# Altium footprint library VESC_MotorController.PcbLib: 146 footprints (part 5 of 10)
Each footprint in its own frame and in the unit in brackets; x right, y up, seen from the top. Pads: shape width x height; smd on the part's side, far side on the other; paste and mask are expansions set on the pad; w line width, h text height; cw(c..) or ccw(c..) is an arc to the next point about the centre after c.
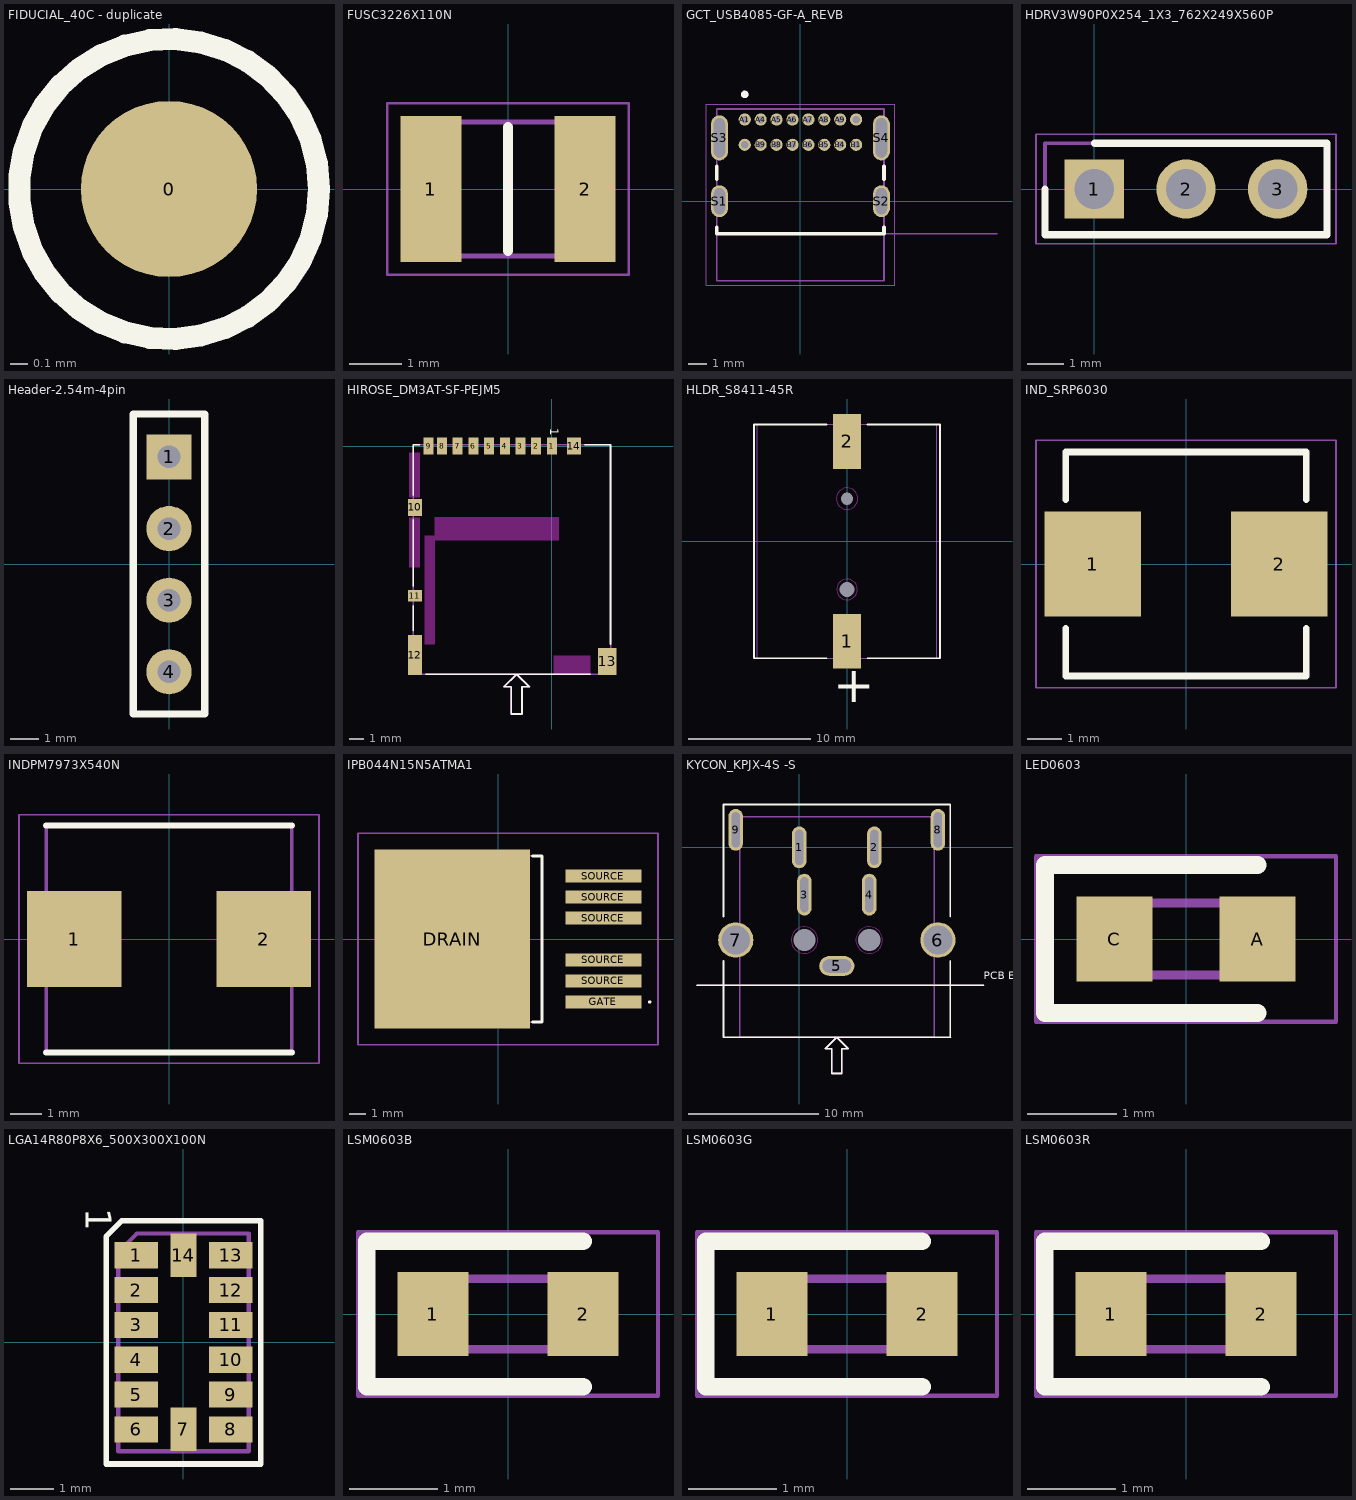
[diagram p4: the footprints below, top view; thin cyan lines are the x and y axes]

## FIDUCIAL_40C - duplicate [mil] "GLOBAL FIDUCIAL"
height 590.55
pads (1):
  round 40 smd paste-78.74 mask+10: 0(0,0)
Top Layer keep-out:
  circle w2: c0,0 r34
Top Overlay:
  circle w5: c0,0 r34
Mechanical 13:
  circle w4: c0,0 r34
  text ".Designator" at 55.03,36.81 h40

## FUSC3226X110N [mm]
pads (2):
  rect 1.18x2.81 smd: 1(-1.485,0) 2(1.485,0)
Top Overlay:
  lines w0.2: 0,-1.188 0,1.188
Mechanical 15:
  lines w0.1: -1.608,-1.288 -1.608,1.288 1.608,1.288 1.608,-1.288 -1.608,-1.288
Mechanical 20:
  lines w0.05: -2.325,-1.655 -2.325,1.655 2.325,1.655 2.325,-1.655 -2.325,-1.655
3D body "srr1210-680m.stp": height 6, standoff -6, extent -6.254,-1.714 5.746,8.286

## GCT_USB4085-GF-A_REVB [mm]
height 3.16
pads (20):
  round 0.65 hole 0.4: A1(-2.975,4.36) A4(-2.125,4.36) A5(-1.275,4.36) A6(-0.425,4.36) A7(0.425,4.36) A8(1.275,4.36) A9(2.125,4.36) A12(2.975,4.36) B1(2.975,3.01) B4(2.125,3.01) B5(1.275,3.01) B6(0.425,3.01) B7(-0.425,3.01) B8(-1.275,3.01) B9(-2.125,3.01) B12(-2.975,3.01)
  oval 0.9x1.7 hole 0.6 slot 1.4 at 90 deg: S1(-4.325,0) S2(4.325,0)
  oval 0.9x2.4 hole 0.6 slot 2.1 at 90 deg: S3(-4.325,3.38) S4(4.325,3.38)
Top Overlay:
  circle w0.2: c-2.975,5.7 r0.1
  lines w0.2: -4.47,-1.39 -4.47,-1.74 4.47,-1.74 4.47,-1.39 ; -4.47,1.17 -4.47,1.85 ; 4.47,1.17 4.47,1.85
Mechanical 13:
  circle w0.2: c-2.975,5.7 r0.1
  lines w0.1: 10.5,-1.74 -4.47,-1.74 ; -4.47,-1.74 -4.47,4.92 4.47,4.92 4.47,-4.25 -4.47,-4.25 -4.47,-1.74
  text "PCB EDGE" at 5.315,-1.57 h0.81
Mechanical 15:
  lines w0.05: -5.025,-4.5 -5.025,5.17 5.025,5.17 5.025,-4.5 -5.025,-4.5
3D body "step_temp.STEP": height 3.46, standoff -2.1, extent -4.47,-4.25 4.47,4.92

## HDRV3W90P0X254_1X3_762X249X560P [mm]
pads (3):
  rect 1.65x1.65 / inner round 1.65 / far side rect 1.65x1.65 hole 1.1: 1(0,0)
  round 1.65 hole 1.1: 2(2.54,0) 3(5.08,0)
Top Overlay:
  lines w0.2: -1.37,0 -1.37,-1.27 6.45,-1.27 6.45,1.27 0,1.27
Mechanical 15:
  lines w0.1: -1.37,-1.27 -1.37,1.27 6.45,1.27 6.45,-1.27 -1.37,-1.27
Mechanical 20:
  lines w0.05: -1.62,-1.52 -1.62,1.52 6.7,1.52 6.7,-1.52 -1.62,-1.52

## Header-2.54m-4pin [mm]
pads (4):
  rect 1.6x1.6 hole 0.8: 1(0,3.81)
  round 1.6 hole 0.8: 2(0,1.27) 3(0,-1.27) 4(0,-3.81)
Top Overlay:
  lines w0.254: -1.27,-5.31 -1.27,5.334 1.27,5.334 1.27,-5.31 -1.27,-5.31

## HIROSE_DM3AT-SF-PEJM5 [mm] "HIROSE_DM3AT-SF-PEJM5"
height 1.83
pads (14):
  rect 0.7x1.2 smd mask+0.051: 1(0,0) 2(-1.1,0) 3(-2.2,0) 4(-3.3,0) 5(-4.4,0) 6(-5.5,0) 7(-6.6,0) 8(-7.7,0) 9(-8.65,0)
  rect 1x1.2 smd mask+0.051: 10(-9.6,-4.3) 14(1.55,0)
  rect 1x0.8 smd mask+0.051: 11(-9.6,-10.5)
  rect 1x2.8 smd mask+0.051: 12(-9.6,-14.65)
  rect 1.3x1.9 smd mask+0.051: 13(3.901,-15.1)
Top Layer keep-out:
  region: -8.2,-6.6 0.5,-6.6 0.5,-5 -8.2,-5
  region: -10.001,-0.45 -10.001,-3.58 -9.25,-3.58 -9.25,-0.45
  region: -10.001,-5.031 -10.001,-8.5 -9.25,-8.5 -9.25,-5.031
  region: -8.9,-6.3 -8.9,-13.9 -8.2,-13.9 -8.2,-6.3
  region: 0.152,-16.049 2.699,-16.049 2.699,-14.699 0.152,-14.699
Top Overlay:
  lines w0.127: -9.725,-3.433 -9.725,0.1 -9.267,0.1 ; -9.723,-5.167 -9.718,-9.829 ; -9.722,-12.95 -9.722,-11.197 ; -8.82,-16.003 2.686,-16.003 ; -2.848,-16.882 -3.354,-16.882 -2.465,-15.993 -1.576,-16.882 -2.084,-16.882 -2.084,-18.787 -2.846,-18.787 -2.846,-16.882 ; 2.317,0.103 4.121,0.103 4.121,-13.883
  text "1" at -0.335,1.237 h1.02
Mechanical 13:
  lines w0.102: -2.867,-16.882 -3.373,-16.882 -2.484,-15.993 -1.595,-16.882 -2.103,-16.882 -2.103,-18.787 ; -2.865,-18.787 -2.865,-16.882 ; -9.724,-16.002 -9.724,0.1 4.126,0.1 4.126,-16.002 -9.724,-16.002
  text "CONFIRM PIN SEQUENCE" at 3.111,-1.202 h1.02
  text ".Designator" at -2.187,-6.29 h1.02
3D body "DM3AT-SF-PEJM5.stp": height 1.68, standoff 0, extent -9.724,-16.05 4.126,0.1

## HLDR_S8411-45R [mm] "S8411-45R,BATTERY HOLDER COIN 12MM SMD"
height 4.25
pads (4):
  rect 2.3x4.5 smd paste-1000 mask+0.051: 1(0,-8.2) 2(0,8.2)
  round 0 hole 1.25 unplated mask+0.051: ""(0,-3.95)
  round 0 hole 1.016 unplated mask+0.051: ""(0,3.5)
Top Overlay:
  lines w0.152: -1.696,9.6 -7.62,9.6 -7.62,-9.6 -1.69,-9.6 ; 1.69,9.6 7.62,9.6 7.62,-9.6 1.696,-9.6
  text "+" at -1.14,-14.17 h5.08
Keep-Out Layer:
  circle w0.051: c0,3.5 r0.886
  circle w0.051: c0,-3.95 r0.846
Mechanical 13:
  lines w0.102: -7.372,-9.6 -7.372,9.6 7.372,9.6 7.372,-9.6 -7.372,-9.6
  text "+" at -1.195,-13.143 h5.08
  text ".Designator" at -0.326,0.961 h1.02
3D body "S8411-45R--3DModel-STEP-56544.STEP": height 4.22, standoff -0.98, extent -7.372,-9.6 7.372,9.6

## IND_SRP6030 [mm]
pads (2):
  rect 2.85x3.1 smd: 1(-2.75,0) 2(2.75,0)
Top Overlay:
  lines w0.2: -3.55,-1.905 -3.55,-3.3 3.55,-3.3 ; -3.55,1.905 -3.55,3.3 ; -3.55,3.3 3.55,3.3 ; 3.55,1.905 3.55,3.3 ; 3.55,-3.3 3.55,-1.905
Mechanical 20:
  lines w0.05: -4.425,-3.65 -4.425,3.65 4.425,3.65 4.425,-3.65 -4.425,-3.65
3D body "SRP6030WA-220M.stp": height 3, standoff 0, extent -3.55,-3.3 3.55,3.3

## INDPM7973X540N [mm]
pads (2):
  rect 3.05x3.1 smd: 1(-3.05,0) 2(3.05,0)
Top Overlay:
  lines w0.2: -3.95,-3.65 3.95,-3.65 ; -3.95,3.65 3.95,3.65
Mechanical 15:
  lines w0.1: -3.95,-3.65 3.95,-3.65 3.95,3.65 -3.95,3.65 -3.95,-3.65
Mechanical 20:
  lines w0.05: -4.825,-4 4.825,-4 4.825,4 -4.825,4 -4.825,-4
3D body "SRP7050WA-220M.stp": height 5.4, standoff 0, extent -3.95,-3.65 3.95,3.65

## IPB044N15N5ATMA1 [mm]
pads (7):
  rect 9.4x10.8 smd: DRAIN(-2.8,0)
  rect 4.6x0.8 smd: GATE(6.35,-3.81) SOURCE(6.35,-2.54) SOURCE(6.35,-1.27) SOURCE(6.35,1.27) SOURCE(6.35,2.54) SOURCE(6.35,3.81)
Top Overlay:
  lines w0.1: 9.1,-3.81 cw(c9.15,-3.81) 9.2,-3.81 cw(c9.15,-3.81) 9.1,-3.81
  lines w0.2: 2.067,-5.027 2.63,-5.027 2.63,5.027 2.067,5.027
Mechanical 15:
  lines w0.1: -6.35,-5.027 2.63,-5.027 2.63,5.027 -6.35,5.027 -6.35,-5.027
Mechanical 20:
  lines w0.1: -8.5,-6.4 9.65,-6.4 9.65,6.4 -8.5,6.4 -8.5,-6.4
3D body "IPB044N15N5ATMA1.stp": height 4.5, standoff 0, extent -6.768,-5 8.267,5

## KYCON_KPJX-4S -S [mil] "KPJX-4S -S,CONN JACK FMALE 4POS TIN SOLDER"
height 590.55
pads (11):
  oval 44x127 hole 107 slot 24 at 0 deg mask+2: 1(0,0) 2(228.35,0) 3(15.75,-143.7) 4(212.6,-143.7) 8(421.26,53.15) 9(-192.91,53.15)
  oval 107x60 hole 40 slot 87 at 0 deg mask+2: 5(114.17,-360.24)
  round 107 hole 87 mask+2: 6(421.26,-281.5) 7(-192.91,-281.5)
  round 0 hole 67 unplated mask+2: ""(15.75,-281.5) ""(212.6,-281.5)
Top Overlay:
  lines w5: -310.55,-419.29 559.45,-419.29 ; -230,-345 -230,-576.77 460,-576.77 ; -230,-210 -230,130 458.35,130 458.35,-210 ; 99.1,-611.77 79.17,-611.77 114.17,-576.77 149.17,-611.77 129.17,-611.77 129.17,-686.77 99.17,-686.77 99.17,-611.77 ; 458.35,-576.77 458.35,-345
  text "PCB EDGE" at 560.62,-410.17 h40
Keep-Out Layer:
  circle w2: c15.75,-281.5 r40.45
  circle w2: c212.6,-281.5 r40.45
Mechanical 13:
  lines w4: -310.55,-419.29 559.45,-419.29 ; 98.36,-611.78 78.43,-611.78 113.43,-576.78 148.43,-611.78 128.43,-611.78 128.43,-686.78 98.43,-686.78 98.43,-611.78 ; -181.1,-576.77 -181.1,92.52 409.45,92.52 409.45,-576.77 -181.1,-576.77
  text ".Designator" at 91.54,-130.55 h40
  text "PCB EDGE" at 570,-439.52 h40
3D body "KPJX-4S-S--3DModel-STEP-56544.STEP": height 590.55, standoff -137.82, extent -201.16,-577.15 428.76,107.89

## LED0603 [mm]
pads (2):
  rect 0.85x0.95 smd: A(0.8,0) C(-0.8,0)
Top Overlay:
  lines w0.2: 0.8,-0.825 -1.575,-0.825 -1.575,0.825 0.8,0.825
Mechanical 15:
  lines w0.1: -0.8,0.133 -0.533,0.4 ; -0.8,-0.4 0.8,-0.4 0.8,0.4 -0.8,0.4 -0.8,-0.4
Mechanical 20:
  lines w0.05: -1.675,-0.925 1.675,-0.925 1.675,0.925 -1.675,0.925 -1.675,-0.925
3D body "SML-D12U1WT86.stp": height 0.54, standoff -0.02, extent -0.8,-0.4 0.8,0.4

## LGA14R80P8X6_500X300X100N [mm] "ADXL343BCCZ-RL7,ACCEL 2-16G I2C/SPI 14LGA"
height 1
pads (14):
  rect 1x0.6 smd mask+0.051: 1(-1.086,2) 2(-1.086,1.2) 3(-1.086,0.4) 4(-1.086,-0.4) 5(-1.086,-1.2) 6(-1.086,-2) 8(1.086,-2) 9(1.086,-1.2) 10(1.086,-0.4) 11(1.086,0.4) 12(1.086,1.2) 13(1.086,2)
  rect 0.6x1 smd mask+0.051: 7(0,-2) 14(0,2)
Top Overlay:
  lines w0.127: -1.778,-2.794 -1.778,2.428 -1.412,2.794 1.778,2.794 1.778,-2.794 -1.778,-2.794
  text "1" at -2.442,3.08 h1.02
Mechanical 13:
  lines w0.102: -1.5,-2.5 -1.5,2.068 -1.068,2.5 1.5,2.5 1.5,-2.5 -1.5,-2.5
  text ".Designator" at -0.077,0.572 h1.02
  text "1" at -1.233,2.062 h1.02
3D body "LGA_CC-14-1_ADI.step": height 1.02, standoff 0, extent -1.625,-2.5 1.625,2.5

## LSM0603B [mm]
pads (2):
  rect 0.8x0.95 smd: 1(-0.85,0) 2(0.85,0)
Top Overlay:
  lines w0.2: 0.85,-0.825 -1.6,-0.825 -1.6,0.825 0.85,0.825
Mechanical 15:
  lines w0.1: -0.8,0.133 -0.533,0.4 ; -0.8,-0.4 -0.8,0.4 0.8,0.4 0.8,-0.4 -0.8,-0.4
Mechanical 20:
  lines w0.05: -1.7,-0.925 -1.7,0.925 1.7,0.925 1.7,-0.925 -1.7,-0.925
3D body "LSM0603B.stp": height 0.55, standoff -0.03, extent -0.8,-0.4 0.8,0.4

## LSM0603G [mm]
pads (2):
  rect 0.8x0.95 smd: 1(-0.85,0) 2(0.85,0)
Top Overlay:
  lines w0.2: 0.85,-0.825 -1.6,-0.825 -1.6,0.825 0.85,0.825
Mechanical 15:
  lines w0.1: -0.8,0.133 -0.533,0.4 ; -0.8,-0.4 0.8,-0.4 0.8,0.4 -0.8,0.4 -0.8,-0.4
Mechanical 20:
  lines w0.05: -1.7,-0.925 1.7,-0.925 1.7,0.925 -1.7,0.925 -1.7,-0.925
3D body "LSM0603453V.stp": height 0.55, standoff -0.03, extent -0.8,-0.4 0.8,0.4

## LSM0603R [mm]
pads (2):
  rect 0.8x0.95 smd: 1(-0.85,0) 2(0.85,0)
Top Overlay:
  lines w0.2: 0.85,-0.825 -1.6,-0.825 -1.6,0.825 0.85,0.825
Mechanical 15:
  lines w0.1: -0.8,0.133 -0.533,0.4 ; -0.8,-0.4 -0.8,0.4 0.8,0.4 0.8,-0.4 -0.8,-0.4
Mechanical 20:
  lines w0.05: -1.7,-0.925 -1.7,0.925 1.7,0.925 1.7,-0.925 -1.7,-0.925
3D body "LSM0603R.stp": height 0.55, standoff -0.03, extent -0.8,-0.4 0.8,0.4